# Altium footprint library 集成IC.PcbLib: 51 footprints (part 1 of 4)
Each footprint in its own frame and in the unit in brackets; x right, y up, seen from the top. Pads: shape width x height; smd on the part's side, far side on the other; paste and mask are expansions set on the pad; w line width, h text height; cw(c..) or ccw(c..) is an arc to the next point about the centre after c.
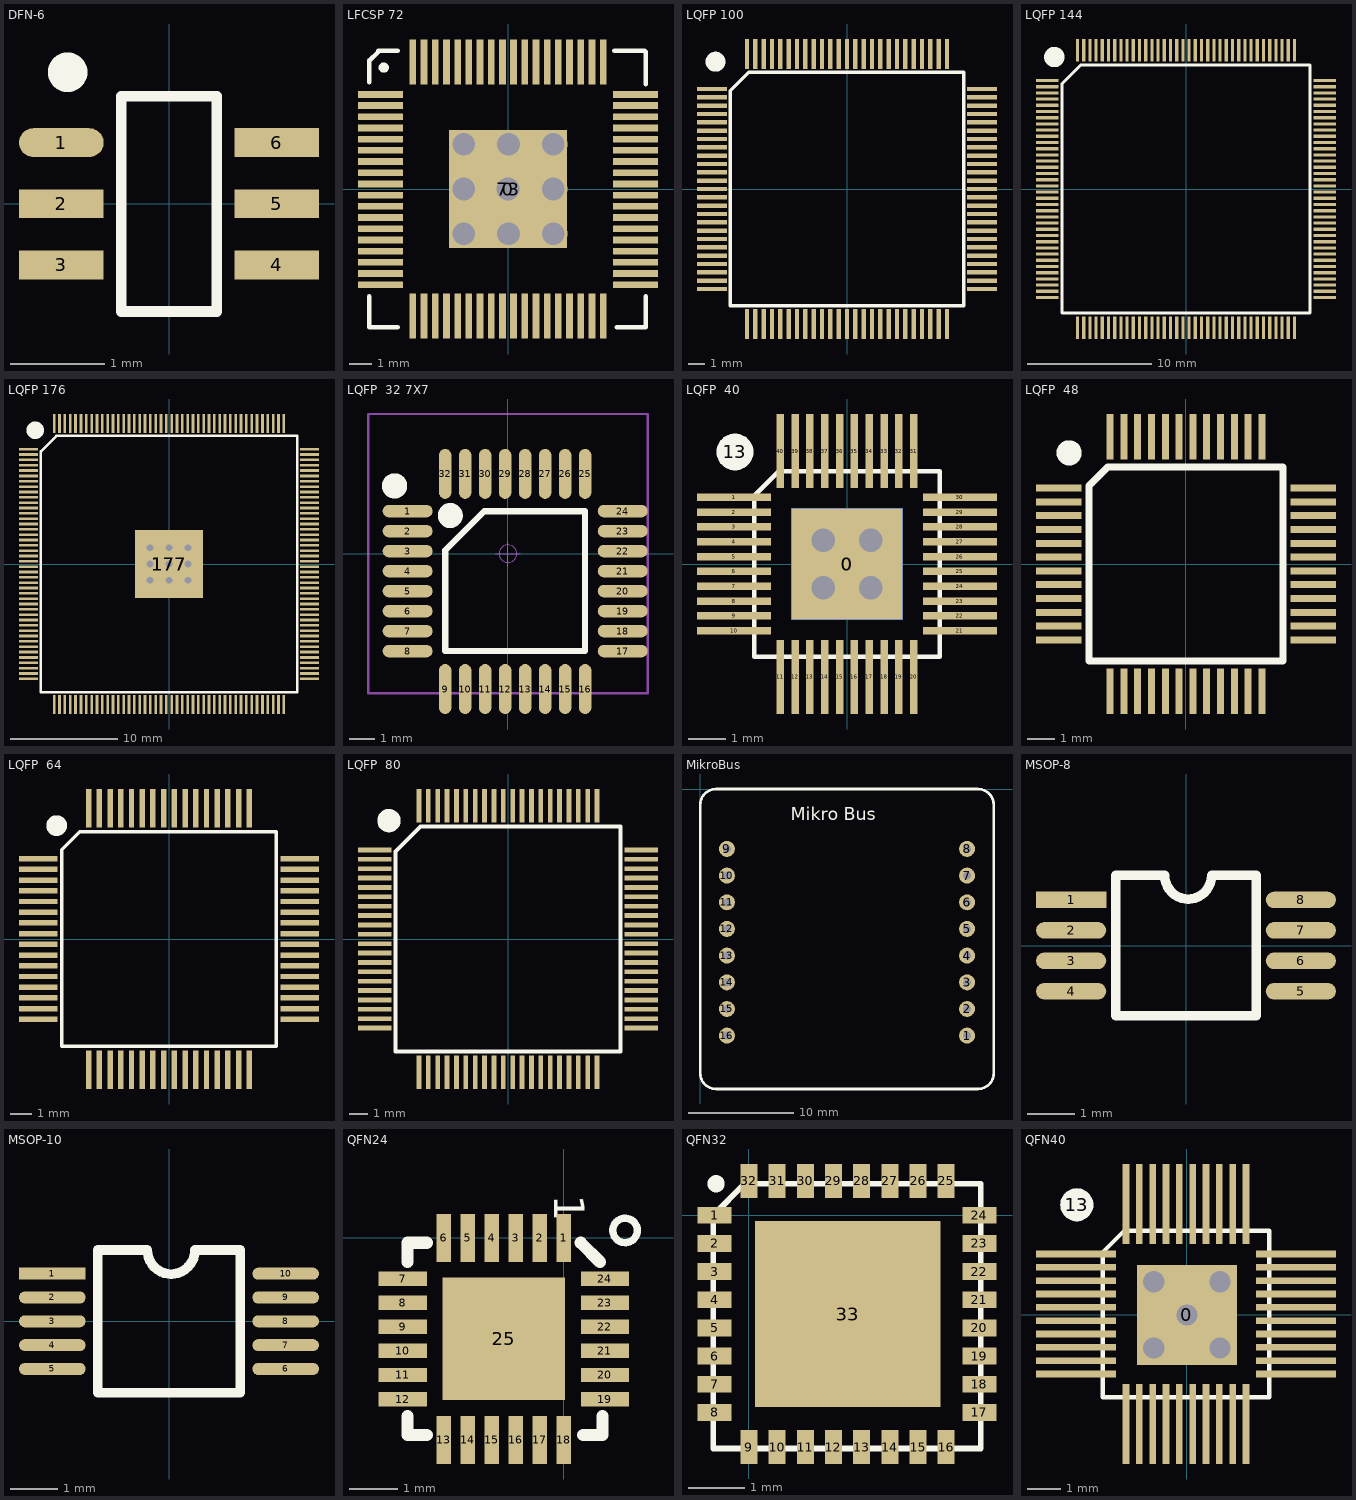
[diagram p0: the footprints below, top view; thin cyan lines are the x and y axes]

## DFN-6 [mil] "SGM4157"
height 35.43
pads (6):
  oval 35.43x12 smd: 1(-45,25.59)
  rect 35.43x12 smd: 2(-45,0) 3(-45,-25.59) 4(45,-25.59) 5(45,0) 6(45,25.59)
Top Overlay:
  circle w11.81: c-42.36,55 r2.36
  lines w4.5: -20,-45 -20,45 20,45 20,-45 -20,-45

## LFCSP 72 [mm] "ADAU1452"
pads (74):
  rect 5.25x5.25 smd: 0(0,0)
  rect 2x0.3 smd: 1(-5.7,4.225) 2(-5.7,3.725) 3(-5.7,3.225) 4(-5.7,2.725) 5(-5.7,2.225) 6(-5.7,1.725) 7(-5.7,1.225) 8(-5.7,0.725) 9(-5.7,0.225) 10(-5.7,-0.275) 11(-5.7,-0.775) 12(-5.7,-1.275) 13(-5.7,-1.775) 14(-5.7,-2.275) 15(-5.7,-2.775) 16(-5.7,-3.275) 17(-5.7,-3.775) 18(-5.7,-4.275) 37(5.7,-4.275) 38(5.7,-3.775) 39(5.7,-3.275) 40(5.7,-2.775) 41(5.7,-2.275) 42(5.7,-1.775) 43(5.7,-1.275) 44(5.7,-0.775) 45(5.7,-0.275) 46(5.7,0.225) 47(5.7,0.725) 48(5.7,1.225) 49(5.7,1.725) 50(5.7,2.225) 51(5.7,2.725) 52(5.7,3.225) 53(5.7,3.725) 54(5.7,4.225)
  rect 0.3x2 smd: 19(-4.25,-5.675) 20(-3.75,-5.675) 21(-3.25,-5.675) 22(-2.75,-5.675) 23(-2.25,-5.675) 24(-1.75,-5.675) 25(-1.25,-5.675) 26(-0.75,-5.675) 27(-0.25,-5.675) 28(0.25,-5.675) 29(0.75,-5.675) 30(1.25,-5.675) 31(1.75,-5.675) 32(2.25,-5.675) 33(2.75,-5.675) 34(3.25,-5.675) 35(3.75,-5.675) 36(4.25,-5.675) 55(4.25,5.675) 56(3.75,5.675) 57(3.25,5.675) 58(2.75,5.675) 59(2.25,5.675) 60(1.75,5.675) 61(1.25,5.675) 62(0.75,5.675) 63(0.25,5.675) 64(-0.25,5.675) 65(-0.75,5.675) 66(-1.25,5.675) 67(-1.75,5.675) 68(-2.25,5.675) 69(-2.75,5.675) 70(-3.25,5.675) 71(-3.75,5.675) 72(-4.25,5.675)
  rect 5.25x5.25 smd far side: 73(0,0)
via 0,0 diameter 1.27 hole 1.016
via 2.019,0.001 diameter 1.27 hole 1.016
via -1.981,0.001 diameter 1.27 hole 1.016
via -1.981,-1.999 diameter 1.27 hole 1.016
via 0.019,-1.999 diameter 1.27 hole 1.016
via 2.019,-1.999 diameter 1.27 hole 1.016
via 2.019,2.001 diameter 1.27 hole 1.016
via 0.019,2.001 diameter 1.27 hole 1.016
via -1.981,2.001 diameter 1.27 hole 1.016
Top Overlay:
  circle w0.254: c-5.55,5.425 r0.1
  lines w0.2: -6.2,-5.775 -6.2,-4.795 ; -6.2,-5.755 -6.2,-6.175 -5.78,-6.175 ; -6.2,4.775 -6.2,5.755 ; -6.2,5.725 -5.78,6.145 ; -5.8,-6.175 -4.92,-6.175 ; -5.8,6.175 -4.92,6.175 ; 4.75,6.175 5.75,6.175 ; 4.85,-6.175 5.75,-6.175 ; 5.7,-6.175 6.1,-6.175 ; 5.7,6.175 6.1,6.175 ; 6.15,-6.175 6.15,-5.755 ; 6.15,-5.775 6.15,-4.795 ; 6.15,4.675 6.15,5.675 ; 6.15,5.625 6.15,6.125
3D body "User Library-LFCSP-72.STEP": height 1, standoff 0, extent -5.011,-5.062 5.029,4.978

## LQFP 100 [mm]
pads (100):
  rect 1.8x0.254 smd: 1(-8.1,6) 2(-8.1,5.5) 3(-8.1,5) 4(-8.1,4.5) 5(-8.1,4) 6(-8.1,3.5) 7(-8.1,3) 8(-8.1,2.5) 9(-8.1,2) 10(-8.1,1.5) 11(-8.1,1) 12(-8.1,0.5) 13(-8.1,0) 14(-8.1,-0.5) 15(-8.1,-1) 16(-8.1,-1.5) 17(-8.1,-2) 18(-8.1,-2.5) 19(-8.1,-3) 20(-8.1,-3.5) 21(-8.1,-4) 22(-8.1,-4.5) 23(-8.1,-5) 24(-8.1,-5.5) 25(-8.1,-6) 51(8.1,-6) 52(8.1,-5.5) 53(8.1,-5) 54(8.1,-4.5) 55(8.1,-4) 56(8.1,-3.5) 57(8.1,-3) 58(8.1,-2.5) 59(8.1,-2) 60(8.1,-1.5) 61(8.1,-1) 62(8.1,-0.5) 63(8.1,0) 64(8.1,0.5) 65(8.1,1) 66(8.1,1.5) 67(8.1,2) 68(8.1,2.5) 69(8.1,3) 70(8.1,3.5) 71(8.1,4) 72(8.1,4.5) 73(8.1,5) 74(8.1,5.5) 75(8.1,6)
  rect 0.254x1.8 smd: 26(-6,-8.1) 27(-5.5,-8.1) 28(-5,-8.1) 29(-4.5,-8.1) 30(-4,-8.1) 31(-3.5,-8.1) 32(-3,-8.1) 33(-2.5,-8.1) 34(-2,-8.1) 35(-1.5,-8.1) 36(-1,-8.1) 37(-0.5,-8.1) 38(0,-8.1) 39(0.5,-8.1) 40(1,-8.1) 41(1.5,-8.1) 42(2,-8.1) 43(2.5,-8.1) 44(3,-8.1) 45(3.5,-8.1) 46(4,-8.1) 47(4.5,-8.1) 48(5,-8.1) 49(5.5,-8.1) 50(6,-8.1) 76(6,8.1) 77(5.5,8.1) 78(5,8.1) 79(4.5,8.1) 80(4,8.1) 81(3.5,8.1) 82(3,8.1) 83(2.5,8.1) 84(2,8.1) 85(1.5,8.1) 86(1,8.1) 87(0.5,8.1) 88(0,8.1) 89(-0.5,8.1) 90(-1,8.1) 91(-1.5,8.1) 92(-2,8.1) 93(-2.5,8.1) 94(-3,8.1) 95(-3.5,8.1) 96(-4,8.1) 97(-4.5,8.1) 98(-5,8.1) 99(-5.5,8.1) 100(-6,8.1)
Top Overlay:
  circle w0.6: c-7.89,7.636 r0.3
  lines w0.2: -7,-7 -7,5.903 -5.903,7 7,7 7,-7 -7,-7
3D body "LQFP100-14x14.STEP": height 1.45, standoff -0.01, extent -8.003,-8.003 8.003,8.003

## LQFP 144 [mm]
pads (144):
  rect 1.8x0.254 smd: 1(-11.2,8.75) 2(-11.2,8.25) 3(-11.2,7.75) 4(-11.2,7.25) 5(-11.2,6.75) 6(-11.2,6.25) 7(-11.2,5.75) 8(-11.2,5.25) 9(-11.2,4.75) 10(-11.2,4.25) 11(-11.2,3.75) 12(-11.2,3.25) 13(-11.2,2.75) 14(-11.2,2.25) 15(-11.2,1.75) 16(-11.2,1.25) 17(-11.2,0.75) 18(-11.2,0.25) 19(-11.2,-0.25) 20(-11.2,-0.75) 21(-11.2,-1.25) 22(-11.2,-1.75) 23(-11.2,-2.25) 24(-11.2,-2.75) 25(-11.2,-3.25) 26(-11.2,-3.75) 27(-11.2,-4.25) 28(-11.2,-4.75) 29(-11.2,-5.25) 30(-11.2,-5.75) 31(-11.2,-6.25) 32(-11.2,-6.75) 33(-11.2,-7.25) 34(-11.2,-7.75) 35(-11.2,-8.25) 36(-11.2,-8.75) 73(11.2,-8.75) 74(11.2,-8.25) 75(11.2,-7.75) 76(11.2,-7.25) 77(11.2,-6.75) 78(11.2,-6.25) 79(11.2,-5.75) 80(11.2,-5.25) 81(11.2,-4.75) 82(11.2,-4.25) 83(11.2,-3.75) 84(11.2,-3.25) 85(11.2,-2.75) 86(11.2,-2.25) 87(11.2,-1.75) 88(11.2,-1.25) 89(11.2,-0.75) 90(11.2,-0.25) 91(11.2,0.25) 92(11.2,0.75) 93(11.2,1.25) 94(11.2,1.75) 95(11.2,2.25) 96(11.2,2.75) 97(11.2,3.25) 98(11.2,3.75) 99(11.2,4.25) 100(11.2,4.75) 101(11.2,5.25) 102(11.2,5.75) 103(11.2,6.25) 104(11.2,6.75) 105(11.2,7.25) 106(11.2,7.75) 107(11.2,8.25) 108(11.2,8.75)
  rect 0.254x1.8 smd: 37(-8.75,-11.2) 38(-8.25,-11.2) 39(-7.75,-11.2) 40(-7.25,-11.2) 41(-6.75,-11.2) 42(-6.25,-11.2) 43(-5.75,-11.2) 44(-5.25,-11.2) 45(-4.75,-11.2) 46(-4.25,-11.2) 47(-3.75,-11.2) 48(-3.25,-11.2) 49(-2.75,-11.2) 50(-2.25,-11.2) 51(-1.75,-11.2) 52(-1.25,-11.2) 53(-0.75,-11.2) 54(-0.25,-11.2) 55(0.25,-11.2) 56(0.75,-11.2) 57(1.25,-11.2) 58(1.75,-11.2) 59(2.25,-11.2) 60(2.75,-11.2) 61(3.25,-11.2) 62(3.75,-11.2) 63(4.25,-11.2) 64(4.75,-11.2) 65(5.25,-11.2) 66(5.75,-11.2) 67(6.25,-11.2) 68(6.75,-11.2) 69(7.25,-11.2) 70(7.75,-11.2) 71(8.25,-11.2) 72(8.75,-11.2) 109(8.75,11.2) 110(8.25,11.2) 111(7.75,11.2) 112(7.25,11.2) 113(6.75,11.2) 114(6.25,11.2) 115(5.75,11.2) 116(5.25,11.2) 117(4.75,11.2) 118(4.25,11.2) 119(3.75,11.2) 120(3.25,11.2) 121(2.75,11.2) 122(2.25,11.2) 123(1.75,11.2) 124(1.25,11.2) 125(0.75,11.2) 126(0.25,11.2) 127(-0.25,11.2) 128(-0.75,11.2) 129(-1.25,11.2) 130(-1.75,11.2) 131(-2.25,11.2) 132(-2.75,11.2) 133(-3.25,11.2) 134(-3.75,11.2) 135(-4.25,11.2) 136(-4.75,11.2) 137(-5.25,11.2) 138(-5.75,11.2) 139(-6.25,11.2) 140(-6.75,11.2) 141(-7.25,11.2) 142(-7.75,11.2) 143(-8.25,11.2) 144(-8.75,11.2)
Top Overlay:
  circle w0.838: c-10.623,10.644 r0.4
  lines w0.254: -10,-10 -10,8.491 -8.491,10 10,10 10,-10 -10,-10
3D body "LQFP144-20x20.STEP": height 1.45, standoff -0.01, extent -11.003,-11.003 11.003,11.003

## LQFP 176 [mm]
pads (179):
  rect 1.8x0.25 smd: 1(-13.15,10.75) 2(-13.15,10.25) 3(-13.15,9.75) 4(-13.15,9.25) 5(-13.15,8.75) 6(-13.15,8.25) 7(-13.15,7.75) 8(-13.15,7.25) 9(-13.15,6.75) 10(-13.15,6.25) 11(-13.15,5.75) 12(-13.15,5.25) 13(-13.15,4.75) 14(-13.15,4.25) 15(-13.15,3.75) 16(-13.15,3.25) 17(-13.15,2.75) 18(-13.15,2.25) 19(-13.15,1.75) 20(-13.15,1.25) 21(-13.15,0.75) 22(-13.15,0.25) 23(-13.15,-0.25) 24(-13.15,-0.75) 25(-13.15,-1.25) 26(-13.15,-1.75) 27(-13.15,-2.25) 28(-13.15,-2.75) 29(-13.15,-3.25) 30(-13.15,-3.75) 31(-13.15,-4.25) 32(-13.15,-4.75) 33(-13.15,-5.25) 34(-13.15,-5.75) 35(-13.15,-6.25) 36(-13.15,-6.75) 37(-13.15,-7.25) 38(-13.15,-7.75) 39(-13.15,-8.25) 40(-13.15,-8.75) 41(-13.15,-9.25) 42(-13.15,-9.75) 43(-13.15,-10.25) 44(-13.15,-10.75) 89(13.15,-10.75) 90(13.15,-10.25) 91(13.15,-9.75) 92(13.15,-9.25) 93(13.15,-8.75) 94(13.15,-8.25) 95(13.15,-7.75) 96(13.15,-7.25) 97(13.15,-6.75) 98(13.15,-6.25) 99(13.15,-5.75) 100(13.15,-5.25) 101(13.15,-4.75) 102(13.15,-4.25) 103(13.15,-3.75) 104(13.15,-3.25) 105(13.15,-2.75) 106(13.15,-2.25) 107(13.15,-1.75) 108(13.15,-1.25) 109(13.15,-0.75) 110(13.15,-0.25) 111(13.15,0.25) 112(13.15,0.75) 113(13.15,1.25) 114(13.15,1.75) 115(13.15,2.25) 116(13.15,2.75) 117(13.15,3.25) 118(13.15,3.75) 119(13.15,4.25) 120(13.15,4.75) 121(13.15,5.25) 122(13.15,5.75) 123(13.15,6.25) 124(13.15,6.75) 125(13.15,7.25) 126(13.15,7.75) 127(13.15,8.25) 128(13.15,8.75) 129(13.15,9.25) 130(13.15,9.75) 131(13.15,10.25) 132(13.15,10.75)
  rect 0.25x1.8 smd: 45(-10.75,-13.15) 46(-10.25,-13.15) 47(-9.75,-13.15) 48(-9.25,-13.15) 49(-8.75,-13.15) 50(-8.25,-13.15) 51(-7.75,-13.15) 52(-7.25,-13.15) 53(-6.75,-13.15) 54(-6.25,-13.15) 55(-5.75,-13.15) 56(-5.25,-13.15) 57(-4.75,-13.15) 58(-4.25,-13.15) 59(-3.75,-13.15) 60(-3.25,-13.15) 61(-2.75,-13.15) 62(-2.25,-13.15) 63(-1.75,-13.15) 64(-1.25,-13.15) 65(-0.75,-13.15) 66(-0.25,-13.15) 67(0.25,-13.15) 68(0.75,-13.15) 69(1.25,-13.15) 70(1.75,-13.15) 71(2.25,-13.15) 72(2.75,-13.15) 73(3.25,-13.15) 74(3.75,-13.15) 75(4.25,-13.15) 76(4.75,-13.15) 77(5.25,-13.15) 78(5.75,-13.15) 79(6.25,-13.15) 80(6.75,-13.15) 81(7.25,-13.15) 82(7.75,-13.15) 83(8.25,-13.15) 84(8.75,-13.15) 85(9.25,-13.15) 86(9.75,-13.15) 87(10.25,-13.15) 88(10.75,-13.15) 133(10.75,13.15) 134(10.25,13.15) 135(9.75,13.15) 136(9.25,13.15) 137(8.75,13.15) 138(8.25,13.15) 139(7.75,13.15) 140(7.25,13.15) 141(6.75,13.15) 142(6.25,13.15) 143(5.75,13.15) 144(5.25,13.15) 145(4.75,13.15) 146(4.25,13.15) 147(3.75,13.15) 148(3.25,13.15) 149(2.75,13.15) 150(2.25,13.15) 151(1.75,13.15) 152(1.25,13.15) 153(0.75,13.15) 154(0.25,13.15) 155(-0.25,13.15) 156(-0.75,13.15) 157(-1.25,13.15) 158(-1.75,13.15) 159(-2.25,13.15) 160(-2.75,13.15) 161(-3.25,13.15) 162(-3.75,13.15) 163(-4.25,13.15) 164(-4.75,13.15) 165(-5.25,13.15) 166(-5.75,13.15) 167(-6.25,13.15) 168(-6.75,13.15) 169(-7.25,13.15) 170(-7.75,13.15) 171(-8.25,13.15) 172(-8.75,13.15) 173(-9.25,13.15) 174(-9.75,13.15) 175(-10.25,13.15) 176(-10.75,13.15)
  rect 6.35x6.35 smd: 177(0,0)
  rect 6x6 on Bottom Paste: 177(0,0)
  rect 6.35x6.35 smd far side: 177(0,0)
via -1.778,0 diameter 0.889 hole 0.635
via 0,0 diameter 0.889 hole 0.635
via 1.778,0 diameter 0.889 hole 0.635
via 1.778,-1.524 diameter 0.889 hole 0.635
via 0,-1.524 diameter 0.889 hole 0.635
via -1.778,-1.524 diameter 0.889 hole 0.635
via 1.778,1.524 diameter 0.889 hole 0.635
via 0,1.524 diameter 0.889 hole 0.635
via -1.778,1.524 diameter 0.889 hole 0.635
Top Overlay:
  circle w0.838: c-12.528,12.524 r0.4
  lines w0.254: -12,-12 -12,10.555 -10.555,12 12,12 12,-12 -12,-12
3D body "LQFP176-24x24.STEP": height 1.45, standoff -0.01, extent -13.003,-13.003 13.003,13.003

## LQFP  32 7X7 [mm] "32脚，体宽7x7mm，脚距0.8mm"
pads (32):
  oval 2x0.5 smd: 1(-4.013,1.702) 2(-4.013,0.902) 3(-4.013,0.102) 4(-4.013,-0.698) 5(-4.013,-1.498) 6(-4.013,-2.298) 7(-4.013,-3.098) 8(-4.013,-3.898) 17(4.593,-3.898) 18(4.593,-3.098) 19(4.593,-2.298) 20(4.593,-1.498) 21(4.593,-0.698) 22(4.593,0.102) 23(4.593,0.902) 24(4.593,1.702)
  oval 0.5x2 smd: 9(-2.51,-5.415) 10(-1.71,-5.415) 11(-0.91,-5.415) 12(-0.11,-5.415) 13(0.69,-5.415) 14(1.49,-5.415) 15(2.29,-5.415) 16(3.09,-5.415) 25(3.09,3.191) 26(2.29,3.191) 27(1.49,3.191) 28(0.69,3.191) 29(-0.11,3.191) 30(-0.91,3.191) 31(-1.71,3.191) 32(-2.51,3.191)
Top Overlay:
  circle w0.5: c-2.307,1.524 r0.25
  circle w0.508: c-4.536,2.712 r0.25
  lines w0.254: -2.504,-3.892 -2.504,0.138 -0.946,1.696 3.084,1.696 3.084,-3.892 -2.504,-3.892
Mechanical 15:
  circle w0.05: c0,0 r0.35
  lines w0.05: -0.5,0 0.5,0 ; 0,-0.5 0,0.5
  lines w0.1: -5.588,-5.588 5.588,-5.588 5.588,5.588 -5.588,5.588 -5.588,-5.588
3D body "LQFP32-7x7.STEP": height 1.45, standoff 0, extent -4.213,-5.601 4.793,3.405

## LQFP  40 [mm]
pads (43):
  rect 3x3 smd: 0(0,0)
  rect 3x3 smd far side: 0(0,0)
  rect 2x0.2 smd: 1(-3.046,1.8) 2(-3.046,1.4) 3(-3.046,1) 4(-3.046,0.6) 5(-3.046,0.2) 6(-3.046,-0.2) 7(-3.046,-0.6) 8(-3.046,-1) 9(-3.046,-1.4) 10(-3.046,-1.8) 21(3.046,-1.8) 22(3.046,-1.4) 23(3.046,-1) 24(3.046,-0.6) 25(3.046,-0.2) 26(3.046,0.2) 27(3.046,0.6) 28(3.046,1) 29(3.046,1.4) 30(3.046,1.8)
  rect 0.2x2 smd: 11(-1.8,-3.046) 12(-1.4,-3.046) 13(-1,-3.046) 14(-0.6,-3.046) 15(-0.2,-3.046) 16(0.2,-3.046) 17(0.6,-3.046) 18(1,-3.046) 19(1.4,-3.046) 20(1.8,-3.046) 31(1.8,3.046) 32(1.4,3.046) 33(1,3.046) 34(0.6,3.046) 35(0.2,3.046) 36(-0.2,3.046) 37(-0.6,3.046) 38(-1,3.046) 39(-1.4,3.046) 40(-1.8,3.046)
  round 1 on Top Overlay: 13(-3.023,3.023)
via -0.635,-0.635 diameter 0.889 hole 0.635
via 0.635,0.635 diameter 0.889 hole 0.635
via 0.635,-0.635 diameter 0.889 hole 0.635
via -0.635,0.635 diameter 0.889 hole 0.635
Top Overlay:
  lines w0.127: -2.5,-2.5 -2.5,1.843 -1.843,2.5 2.5,2.5 2.5,-2.5 -2.5,-2.5

## LQFP  48 [mm]
pads (48):
  rect 1.651x0.254 smd: 1(-4.6,2.75) 2(-4.6,2.25) 3(-4.6,1.75) 4(-4.6,1.25) 5(-4.6,0.75) 6(-4.6,0.25) 7(-4.6,-0.25) 8(-4.6,-0.75) 9(-4.6,-1.25) 10(-4.6,-1.75) 11(-4.6,-2.25) 12(-4.6,-2.75) 25(4.6,-2.75) 26(4.6,-2.25) 27(4.6,-1.75) 28(4.6,-1.25) 29(4.6,-0.75) 30(4.6,-0.25) 31(4.6,0.25) 32(4.6,0.75) 33(4.6,1.25) 34(4.6,1.75) 35(4.6,2.25) 36(4.6,2.75)
  rect 0.254x1.651 smd: 13(-2.75,-4.6) 14(-2.25,-4.6) 15(-1.75,-4.6) 16(-1.25,-4.6) 17(-0.75,-4.6) 18(-0.25,-4.6) 19(0.25,-4.6) 20(0.75,-4.6) 21(1.25,-4.6) 22(1.75,-4.6) 23(2.25,-4.6) 24(2.75,-4.6) 37(2.75,4.6) 38(2.25,4.6) 39(1.75,4.6) 40(1.25,4.6) 41(0.75,4.6) 42(0.25,4.6) 43(-0.25,4.6) 44(-0.75,4.6) 45(-1.25,4.6) 46(-1.75,4.6) 47(-2.25,4.6) 48(-2.75,4.6)
Top Overlay:
  circle w0.635: c-4.228,4.02 r0.136
  lines w0.254: -3.5,-3.5 3.5,-3.5 3.5,3.5 -2.834,3.5 -3.5,2.834 -3.5,-3.5
3D body "LQFP48-7x7.STEP": height 1.45, standoff 0, extent -4.503,-4.503 4.503,4.503

## LQFP  64 [mm]
pads (64):
  rect 1.8x0.254 smd: 1(-6.1,3.75) 2(-6.1,3.25) 3(-6.1,2.75) 4(-6.1,2.25) 5(-6.1,1.75) 6(-6.1,1.25) 7(-6.1,0.75) 8(-6.1,0.25) 9(-6.1,-0.25) 10(-6.1,-0.75) 11(-6.1,-1.25) 12(-6.1,-1.75) 13(-6.1,-2.25) 14(-6.1,-2.75) 15(-6.1,-3.25) 16(-6.1,-3.75) 33(6.1,-3.75) 34(6.1,-3.25) 35(6.1,-2.75) 36(6.1,-2.25) 37(6.1,-1.75) 38(6.1,-1.25) 39(6.1,-0.75) 40(6.1,-0.25) 41(6.1,0.25) 42(6.1,0.75) 43(6.1,1.25) 44(6.1,1.75) 45(6.1,2.25) 46(6.1,2.75) 47(6.1,3.25) 48(6.1,3.75)
  rect 0.254x1.8 smd: 17(-3.75,-6.1) 18(-3.25,-6.1) 19(-2.75,-6.1) 20(-2.25,-6.1) 21(-1.75,-6.1) 22(-1.25,-6.1) 23(-0.75,-6.1) 24(-0.25,-6.1) 25(0.25,-6.1) 26(0.75,-6.1) 27(1.25,-6.1) 28(1.75,-6.1) 29(2.25,-6.1) 30(2.75,-6.1) 31(3.25,-6.1) 32(3.75,-6.1) 49(3.75,6.1) 50(3.25,6.1) 51(2.75,6.1) 52(2.25,6.1) 53(1.75,6.1) 54(1.25,6.1) 55(0.75,6.1) 56(0.25,6.1) 57(-0.25,6.1) 58(-0.75,6.1) 59(-1.25,6.1) 60(-1.75,6.1) 61(-2.25,6.1) 62(-2.75,6.1) 63(-3.25,6.1) 64(-3.75,6.1)
Top Overlay:
  circle w0.635: c-5.244,5.29 r0.165
  lines w0.15: -5,-5 5,-5 5,5 -4.169,5 -5,4.169 -5,-5
3D body "LQFP64-10x10.STEP": height 1.45, standoff -0.01, extent -6.003,-6.003 6.003,6.003

## LQFP  80 [mm]
pads (80):
  rect 1.8x0.254 smd: 1(-7.1,4.75) 2(-7.1,4.25) 3(-7.1,3.75) 4(-7.1,3.25) 5(-7.1,2.75) 6(-7.1,2.25) 7(-7.1,1.75) 8(-7.1,1.25) 9(-7.1,0.75) 10(-7.1,0.25) 11(-7.1,-0.25) 12(-7.1,-0.75) 13(-7.1,-1.25) 14(-7.1,-1.75) 15(-7.1,-2.25) 16(-7.1,-2.75) 17(-7.1,-3.25) 18(-7.1,-3.75) 19(-7.1,-4.25) 20(-7.1,-4.75) 41(7.1,-4.75) 42(7.1,-4.25) 43(7.1,-3.75) 44(7.1,-3.25) 45(7.1,-2.75) 46(7.1,-2.25) 47(7.1,-1.75) 48(7.1,-1.25) 49(7.1,-0.75) 50(7.1,-0.25) 51(7.1,0.25) 52(7.1,0.75) 53(7.1,1.25) 54(7.1,1.75) 55(7.1,2.25) 56(7.1,2.75) 57(7.1,3.25) 58(7.1,3.75) 59(7.1,4.25) 60(7.1,4.75)
  rect 0.254x1.8 smd: 21(-4.75,-7.1) 22(-4.25,-7.1) 23(-3.75,-7.1) 24(-3.25,-7.1) 25(-2.75,-7.1) 26(-2.25,-7.1) 27(-1.75,-7.1) 28(-1.25,-7.1) 29(-0.75,-7.1) 30(-0.25,-7.1) 31(0.25,-7.1) 32(0.75,-7.1) 33(1.25,-7.1) 34(1.75,-7.1) 35(2.25,-7.1) 36(2.75,-7.1) 37(3.25,-7.1) 38(3.75,-7.1) 39(4.25,-7.1) 40(4.75,-7.1) 61(4.75,7.1) 62(4.25,7.1) 63(3.75,7.1) 64(3.25,7.1) 65(2.75,7.1) 66(2.25,7.1) 67(1.75,7.1) 68(1.25,7.1) 69(0.75,7.1) 70(0.25,7.1) 71(-0.25,7.1) 72(-0.75,7.1) 73(-1.25,7.1) 74(-1.75,7.1) 75(-2.25,7.1) 76(-2.75,7.1) 77(-3.25,7.1) 78(-3.75,7.1) 79(-4.25,7.1) 80(-4.75,7.1)
Top Overlay:
  circle w0.635: c-6.35,6.314 r0.305
  lines w0.2: -6,-6 -6,4.668 -4.668,6 6,6 6,-6 -6,-6
3D body "LQFP80-12x12.STEP": height 1.45, standoff -0.01, extent -7.003,-7.003 7.003,7.003

## MikroBus [mil] "Mikro Bus General Purpose Module"
pads (16):
  round 60 hole 30: 1(1000,-924.8) 2(1000,-824.8) 3(1000,-724.8) 4(1000,-624.8) 5(1000,-524.8) 6(1000,-424.8) 7(1000,-324.8) 8(1000,-224.8) 9(100,-224.8) 10(100,-324.8) 11(100,-424.8) 12(100,-524.8) 13(100,-624.8) 14(100,-724.8) 15(100,-824.8) 16(100,-924.8)
Top Overlay:
  lines w10: -0.06,-1065.75 ccw(c59,-1065.75) 59,-1124.8 1041,-1124.8 ccw(c1041,-1065.75) 1100.06,-1065.75 ; -0.06,-59.06 cw(c59,-59.06) 59,0 1040.94,0 ; 0,-1065.75 0,-59.06 ; 1040.94,0.06 cw(c1040.94,-59) 1100,-59 1100,-1065.75
  text "Mikro Bus" at 339,-118 h47.24

## MSOP-8 [mm]
pads (8):
  rect 1.5x0.35 smd: 1(-2.45,0.975)
  oval 1.5x0.35 smd: 2(-2.45,0.325) 3(-2.45,-0.325) 4(-2.45,-0.975) 5(2.45,-0.975) 6(2.45,-0.325) 7(2.45,0.325) 8(2.45,0.975)
Top Overlay:
  lines w0.2: -1.499,1.499 -1.499,-1.499 1.499,-1.499 1.499,1.499
  lines w0.203: -1.499,1.499 -0.465,1.499 ; -0.455,1.499 ccw(c0.053,1.499) 0.053,0.991 ; 0.037,0.991 ccw(c0.037,1.499) 0.545,1.499 ; 0.551,1.499 1.499,1.499
3D body "MSOP-8.STEP": height 0.95, standoff 0, extent -2.45,-1.5 2.45,1.5

## MSOP-10 [mm]
pads (10):
  rect 1.4x0.254 smd: 1(-2.45,1)
  oval 1.4x0.254 smd: 2(-2.45,0.5) 3(-2.45,0) 4(-2.45,-0.5) 5(-2.45,-1) 6(2.45,-1) 7(2.45,-0.5) 8(2.45,0) 9(2.45,0.5) 10(2.45,1)
Top Overlay:
  lines w0.2: -1.499,1.499 -1.499,-1.499 1.499,-1.499 1.499,1.499
  lines w0.203: -1.499,1.499 -0.465,1.499 ; -0.455,1.499 ccw(c0.053,1.499) 0.053,0.991 ; 0.037,0.991 ccw(c0.037,1.499) 0.545,1.499 ; 0.551,1.499 1.499,1.499
3D body "MSOP-10.STEP": height 0.95, standoff 0, extent -2.45,-1.5 2.45,1.5

## QFN24 [mm]
pads (25):
  rect 0.3x1 smd: 1(0,0) 2(-0.5,0) 3(-1,0) 4(-1.5,0) 5(-2,0) 6(-2.5,0) 13(-2.5,-4.2) 14(-2,-4.2) 15(-1.5,-4.2) 16(-1,-4.2) 17(-0.5,-4.2) 18(0,-4.2)
  rect 1x0.3 smd: 7(-3.35,-0.85) 8(-3.35,-1.35) 9(-3.35,-1.85) 10(-3.35,-2.35) 11(-3.35,-2.85) 12(-3.35,-3.35) 19(0.85,-3.35) 20(0.85,-2.85) 21(0.85,-2.35) 22(0.85,-1.85) 23(0.85,-1.35) 24(0.85,-0.85)
  rect 2.548x2.548 smd: 25(-1.25,-2.1)
Top Overlay:
  circle w0.152: c1.27,0.154 r0.254
  lines w0.254: -3.25,-3.7 -3.25,-4.1 -2.85,-4.1 ; -3.25,-0.5 -3.25,-0.1 -2.85,-0.1 ; 0.35,-0.1 0.75,-0.5 ; 0.4,-4.1 0.8,-4.1 0.8,-3.7 ; 0.75,-0.5 0.75,-0.5
  text "1" at -0.2,0.9 h0.64

## QFN32 [mm] "BK953* 5x5"
pads (33):
  rect 0.6x0.3 smd: 1(-0.61,0) 2(-0.61,-0.5) 3(-0.61,-1) 4(-0.61,-1.5) 5(-0.61,-2) 6(-0.61,-2.5) 7(-0.61,-3) 8(-0.61,-3.5) 17(4.089,-3.5) 18(4.089,-3) 19(4.089,-2.5) 20(4.089,-2) 21(4.089,-1.5) 22(4.089,-1) 23(4.089,-0.5) 24(4.089,0)
  rect 0.3x0.6 smd: 9(0,-4.115) 10(0.5,-4.115) 11(1,-4.115) 12(1.5,-4.115) 13(2,-4.115) 14(2.5,-4.115) 15(3,-4.115) 16(3.5,-4.115) 25(3.5,0.61) 26(3,0.61) 27(2.5,0.61) 28(2,0.61) 29(1.5,0.61) 30(1,0.61) 31(0.5,0.61) 32(0,0.61)
  rect 3.3x3.3 smd: 33(1.753,-1.753)
Top Overlay:
  circle w0.254: c-0.584,0.559 r0.025
  lines w0.1: -0.635,-4.14 4.115,-4.14 4.115,0.559 -0.076,0.559 -0.635,0 -0.635,-4.14

## QFN40 [mm] "AP3500   5*5MM"
pads (42):
  rect 3x3 smd: 0(0,0)
  rect 2.4x0.2 smd: 1(-3.325,1.825) 2(-3.325,1.425) 3(-3.325,1.025) 4(-3.325,0.625) 5(-3.325,0.225) 6(-3.325,-0.175) 7(-3.325,-0.575) 8(-3.325,-0.975) 9(-3.325,-1.375) 10(-3.325,-1.775) 21(3.275,-1.775) 22(3.275,-1.375) 23(3.275,-0.975) 24(3.275,-0.575) 25(3.275,-0.175) 26(3.275,0.225) 27(3.275,0.625) 28(3.275,1.025) 29(3.275,1.425) 30(3.275,1.825)
  rect 0.2x2.4 smd: 11(-1.825,-3.275) 12(-1.425,-3.275) 13(-1.025,-3.275) 14(-0.625,-3.275) 15(-0.225,-3.275) 16(0.175,-3.275) 17(0.575,-3.275) 18(0.975,-3.275) 19(1.375,-3.275) 20(1.775,-3.275) 31(1.775,3.325) 32(1.375,3.325) 33(0.975,3.325) 34(0.575,3.325) 35(0.175,3.325) 36(-0.225,3.325) 37(-0.625,3.325) 38(-1.025,3.325) 39(-1.425,3.325) 40(-1.825,3.325)
  round 1 on Top Overlay: 13(-3.302,3.302)
via -0.991,-0.991 diameter 0.889 hole 0.635
via 0.991,0.991 diameter 0.889 hole 0.635
via 0.991,-0.991 diameter 0.889 hole 0.635
via -0.991,0.991 diameter 0.889 hole 0.635
via 0,0 diameter 0.889 hole 0.635
Top Overlay:
  lines w0.127: -2.525,-2.475 2.475,-2.475 2.475,2.525 -1.869,2.525 -2.525,1.869 -2.525,-2.475